# Altium footprint library FootprintHole.PcbLib: 100 footprints (part 3 of 7)
Each footprint in its own frame and in the unit in brackets; x right, y up, seen from the top. Pads: shape width x height; smd on the part's side, far side on the other; paste and mask are expansions set on the pad; w line width, h text height; cw(c..) or ccw(c..) is an arc to the next point about the centre after c.
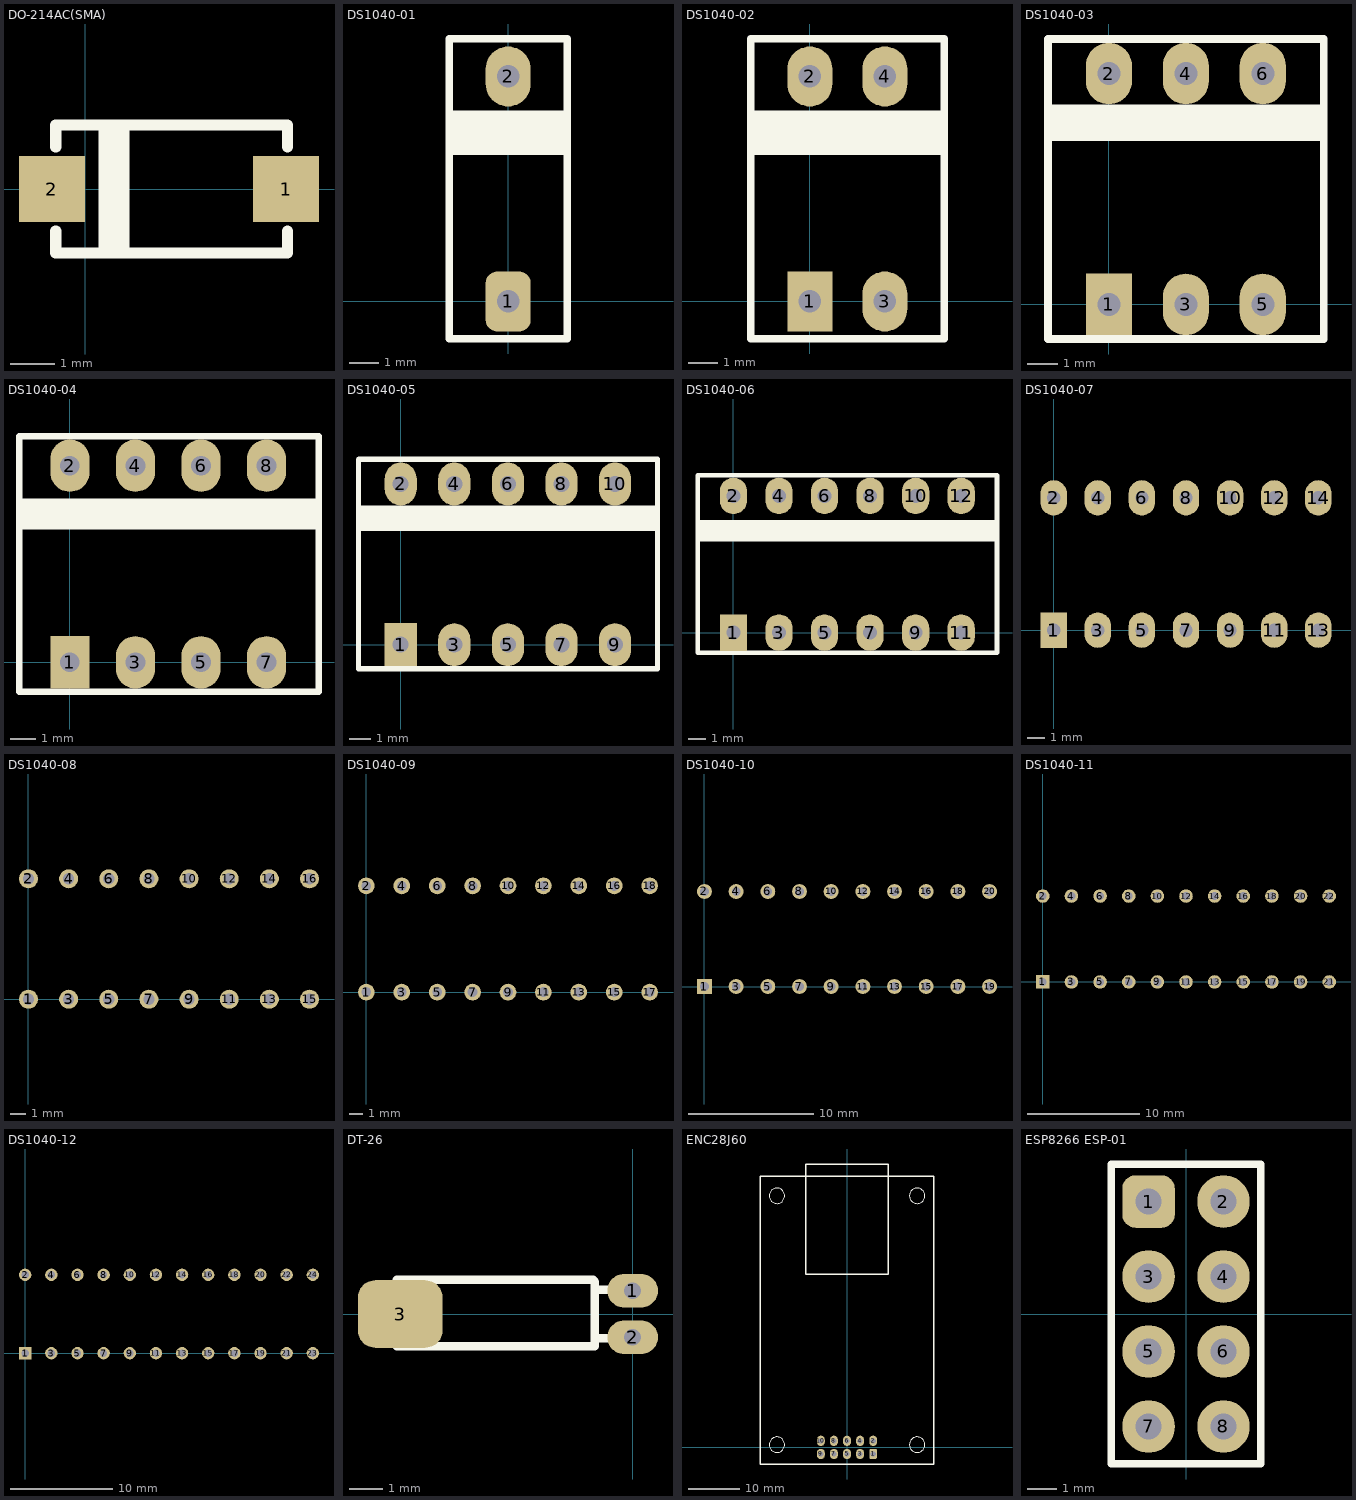
[diagram p2: the footprints below, top view; thin cyan lines are the x and y axes]

## DO-214AC(SMA) [mm]
pads (2):
  rect 1.5x1.5 smd: 1(4.572,0) 2(-0.762,0)
Top Overlay:
  rectangle: 0.3,-1.5 1,1.5
  lines w0.254: -0.675,-0.96 -0.675,-1.46 4.605,-1.46 4.605,-0.96 ; -0.675,0.96 -0.675,1.46 4.605,1.46 4.605,0.96
3D body "Diode SMA.stp": height 2.41, standoff 0, extent -0.675,-1.46 4.605,1.46

## DS1040-01 [mil]
pads (2):
  rrect50% 60x80 hole 30: 1(0,0)
  oval 60x80 hole 30: 2(0,300)
Top Overlay:
  rectangle: -80,195 79.45,255
  lines w10: -78.74,-50 -78.74,350 78.74,350 78.74,-50 -78.74,-50
3D body "DS1040-01 (DIP_switch).stp": height 267.72, standoff -151.57, extent -78.74,-44.88 78.74,344.88

## DS1040-02 [mil]
pads (4):
  rect 60x80 hole 30: 1(0,0)
  oval 60x80 hole 30: 2(0,300) 3(100,0) 4(100,300)
Top Overlay:
  rectangle: -80,195 177.87,255
  lines w10: -78.94,-50 178.94,-50 178.94,350 -78.94,350 -78.94,-50
3D body "DS1040-02 (DIP_switch).stp": height 267.72, standoff -151.57, extent -78.73,-44.88 178.75,344.89

## DS1040-03 [mil]
pads (6):
  rect 60x80 hole 30: 1(0,0)
  oval 60x80 hole 30: 2(0,300) 3(100,0) 4(100,300) 5(200,0) 6(200,300)
Top Overlay:
  rectangle: -78.74,212.6 279.53,259.84
  lines w10: -79.13,-44.88 -79.13,344.88 279.13,344.88 279.13,-44.88 -79.13,-44.88
3D body "DS1040-03 (DIP_switch).stp": height 267.72, standoff -151.57, extent -78.74,-44.88 278.74,344.88

## DS1040-04 [mil]
pads (8):
  rect 60x80 hole 30: 1(0,0)
  oval 60x80 hole 30: 2(0,300) 3(100,0) 4(100,300) 5(200,0) 6(200,300) 7(300,0) 8(300,300)
Top Overlay:
  rectangle: -77.68,202.76 380,250
  lines w10: -77.36,-44.88 379.33,-44.88 379.33,344.88 -77.36,344.88 -77.36,-44.88
3D body "DS1040-04 (DIP_switch).stp": height 267.72, standoff -151.57, extent -78.73,-44.88 378.75,344.89

## DS1040-05 [mil]
pads (10):
  rect 60x80 hole 30: 1(0,0)
  oval 60x80 hole 30: 2(0,300) 3(100,0) 4(100,300) 5(200,0) 6(200,300) 7(300,0) 8(300,300) 9(400,0) 10(400,300)
Top Overlay:
  rectangle: -79.72,212.6 480.31,259.84
  lines w10: -78.74,-45.28 -78.74,345.47 -77.76,346.46 479.33,346.46 479.33,-45.28 -78.74,-45.28
3D body "DS1040-05 (DIP_switch).stp": height 267.72, standoff -151.57, extent -78.73,-44.88 478.75,344.89

## DS1040-06 [mil]
pads (12):
  rect 60x80 hole 30: 1(0,0)
  oval 60x80 hole 30: 2(0,300) 3(100,0) 4(100,300) 5(200,0) 6(200,300) 7(300,0) 8(300,300) 9(400,0) 10(400,300) 11(500,0) 12(500,300)
Top Overlay:
  rectangle: -80,200 577.48,247.24
  lines w10: -78.74,-44.29 -78.74,345.47 578.74,345.47 578.74,-44.29 -78.74,-44.29
3D body "DS1040-06 (DIP_switch).stp": height 267.72, standoff -151.57, extent -78.73,-44.88 578.75,344.89

## DS1040-07 [mil]
pads (14):
  rect 60x80 hole 30: 1(0,0)
  oval 60x80 hole 30: 2(0,300) 3(100,0) 4(100,300) 5(200,0) 6(200,300) 7(300,0) 8(300,300) 9(400,0) 10(400,300) 11(500,0) 12(500,300) 13(600,0) 14(600,300)
3D body "DS1040-07 (DIP_switch).stp": height 267.72, standoff -151.57, extent -78.73,-44.88 678.75,344.89

## DS1040-08 [mm]
pads (16):
  round 1.2 hole 0.7: 1(0,0) 2(0,7.62) 3(2.54,0) 4(2.54,7.62) 5(5.08,0) 6(5.08,7.62) 7(7.62,0) 8(7.62,7.62) 9(10.16,0) 10(10.16,7.62) 11(12.7,0) 12(12.7,7.62) 13(15.24,0) 14(15.24,7.62) 15(17.78,0) 16(17.78,7.62)
3D body "DS1040-08 (DIP_switch).stp": height 6.8, standoff -3.85, extent -2,-1.14 19.78,8.76

## DS1040-09 [mm]
pads (18):
  round 1.2 hole 0.7: 1(0,0) 2(0,7.62) 3(2.54,0) 4(2.54,7.62) 5(5.08,0) 6(5.08,7.62) 7(7.62,0) 8(7.62,7.62) 9(10.16,0) 10(10.16,7.62) 11(12.7,0) 12(12.7,7.62) 13(15.24,0) 14(15.24,7.62) 15(17.78,0) 16(17.78,7.62) 17(20.32,0) 18(20.32,7.62)
3D body "DS1040-09 (DIP_switch).stp": height 6.8, standoff -3.85, extent -2,-1.14 22.32,8.76

## DS1040-10 [mm]
pads (20):
  rect 1.2x1.2 hole 0.7: 1(0,0)
  round 1.2 hole 0.7: 2(0,7.62) 3(2.54,0) 4(2.54,7.62) 5(5.08,0) 6(5.08,7.62) 7(7.62,0) 8(7.62,7.62) 9(10.16,0) 10(10.16,7.62) 11(12.7,0) 12(12.7,7.62) 13(15.24,0) 14(15.24,7.62) 15(17.78,0) 16(17.78,7.62) 17(20.32,0) 18(20.32,7.62) 19(22.86,0) 20(22.86,7.62)
3D body "DS1040-10 (DIP_switch).stp": height 6.8, standoff -3.85, extent -2,-1.14 24.86,8.76

## DS1040-11 [mm]
pads (22):
  rect 1.2x1.2 hole 0.7: 1(0,0)
  round 1.2 hole 0.7: 2(0,7.62) 3(2.54,0) 4(2.54,7.62) 5(5.08,0) 6(5.08,7.62) 7(7.62,0) 8(7.62,7.62) 9(10.16,0) 10(10.16,7.62) 11(12.7,0) 12(12.7,7.62) 13(15.24,0) 14(15.24,7.62) 15(17.78,0) 16(17.78,7.62) 17(20.32,0) 18(20.32,7.62) 19(22.86,0) 20(22.86,7.62) 21(25.4,0) 22(25.4,7.62)
3D body "DS1040-11 (DIP_switch).stp": height 6.8, standoff -3.85, extent -2,-1.14 27.4,8.76

## DS1040-12 [mm]
pads (24):
  rect 1.2x1.2 hole 0.7: 1(0,0)
  round 1.2 hole 0.7: 2(0,7.62) 3(2.54,0) 4(2.54,7.62) 5(5.08,0) 6(5.08,7.62) 7(7.62,0) 8(7.62,7.62) 9(10.16,0) 10(10.16,7.62) 11(12.7,0) 12(12.7,7.62) 13(15.24,0) 14(15.24,7.62) 15(17.78,0) 16(17.78,7.62) 17(20.32,0) 18(20.32,7.62) 19(22.86,0) 20(22.86,7.62) 21(25.4,0) 22(25.4,7.62) 23(27.94,0) 24(27.94,7.62)
3D body "DS1040-12 (DIP_switch).stp": height 6.8, standoff -3.85, extent -2,-1.14 29.94,8.76

## DT-26 [mil]
pads (3):
  oval 60x40 hole 20: 1(0,27.56) 2(0,-27.56)
  rrect50% 100x80 smd: 3(-275,0)
Top Overlay:
  lines w10: -43.9,28.54 -16.35,28.54 ; -42.92,-28.55 -15.36,-28.55 ; -279.14,-38.39 -279.14,40.35 -46.86,40.35 -44.89,38.38 -44.89,-38.39 -46.86,-38.39 -279.14,-38.39
3D body "User Library-DT-26-1.STEP": height 78.74, standoff -78.74, extent -275.2,-39.37 5.91,39.37

## ENC28J60 [mm]
pads (10):
  rrect50% 1.524x2 hole 1: 1(5.08,-1.27)
  oval 1.524x2 hole 1: 2(5.08,1.27) 3(2.54,-1.27) 4(2.54,1.27) 5(0,-1.27) 6(0,1.27) 7(-2.54,-1.27) 8(-2.54,1.27) 9(-5.08,-1.27) 10(-5.08,1.27)
Top Overlay:
  circle w0.15: c13.6,0.53 r1.5
  circle w0.15: c-13.6,0.53 r1.5
  circle w0.15: c-13.6,48.83 r1.5
  circle w0.15: c13.6,48.83 r1.5
  lines w0.254: -8,52.578 -8,55 8,55 8,52.578 ; -8,52.58 -8,33.58 8,33.58 8,52.58 ; -16.851,-3.22 16.85,-3.22 16.85,52.58 -16.851,52.58 -16.851,-3.22
3D body "10-Pin Header - Female - Double - 2.54mm.step": height 8.5, standoff -3, extent -6.6,-2.511 6.6,2.489

## ESP8266 ESP-01 [mil]
pads (8):
  rrect50% 70x70 hole 35: 1(-50,150)
  round 70 hole 35: 2(50,150) 3(-50,50) 4(50,50) 5(-50,-50) 6(50,-50) 7(-50,-150) 8(50,-150)
Top Overlay:
  lines w10: -100,-200 100,-200 100,200 -100,200 -100,-200
3D body "User Library-ESP8266 ESP-01.STEP": height 231.4, standoff -228.35, extent -868.38,-285.43 108,285.44